# Altium footprint library Connector_PinHeader_1.00mm.PcbLib: 278 footprints (part 13 of 18)
Each footprint in its own frame and in the unit in brackets; x right, y up, seen from the top. Pads: shape width x height; smd on the part's side, far side on the other; paste and mask are expansions set on the pad; w line width, h text height; cw(c..) or ccw(c..) is an arc to the next point about the centre after c.
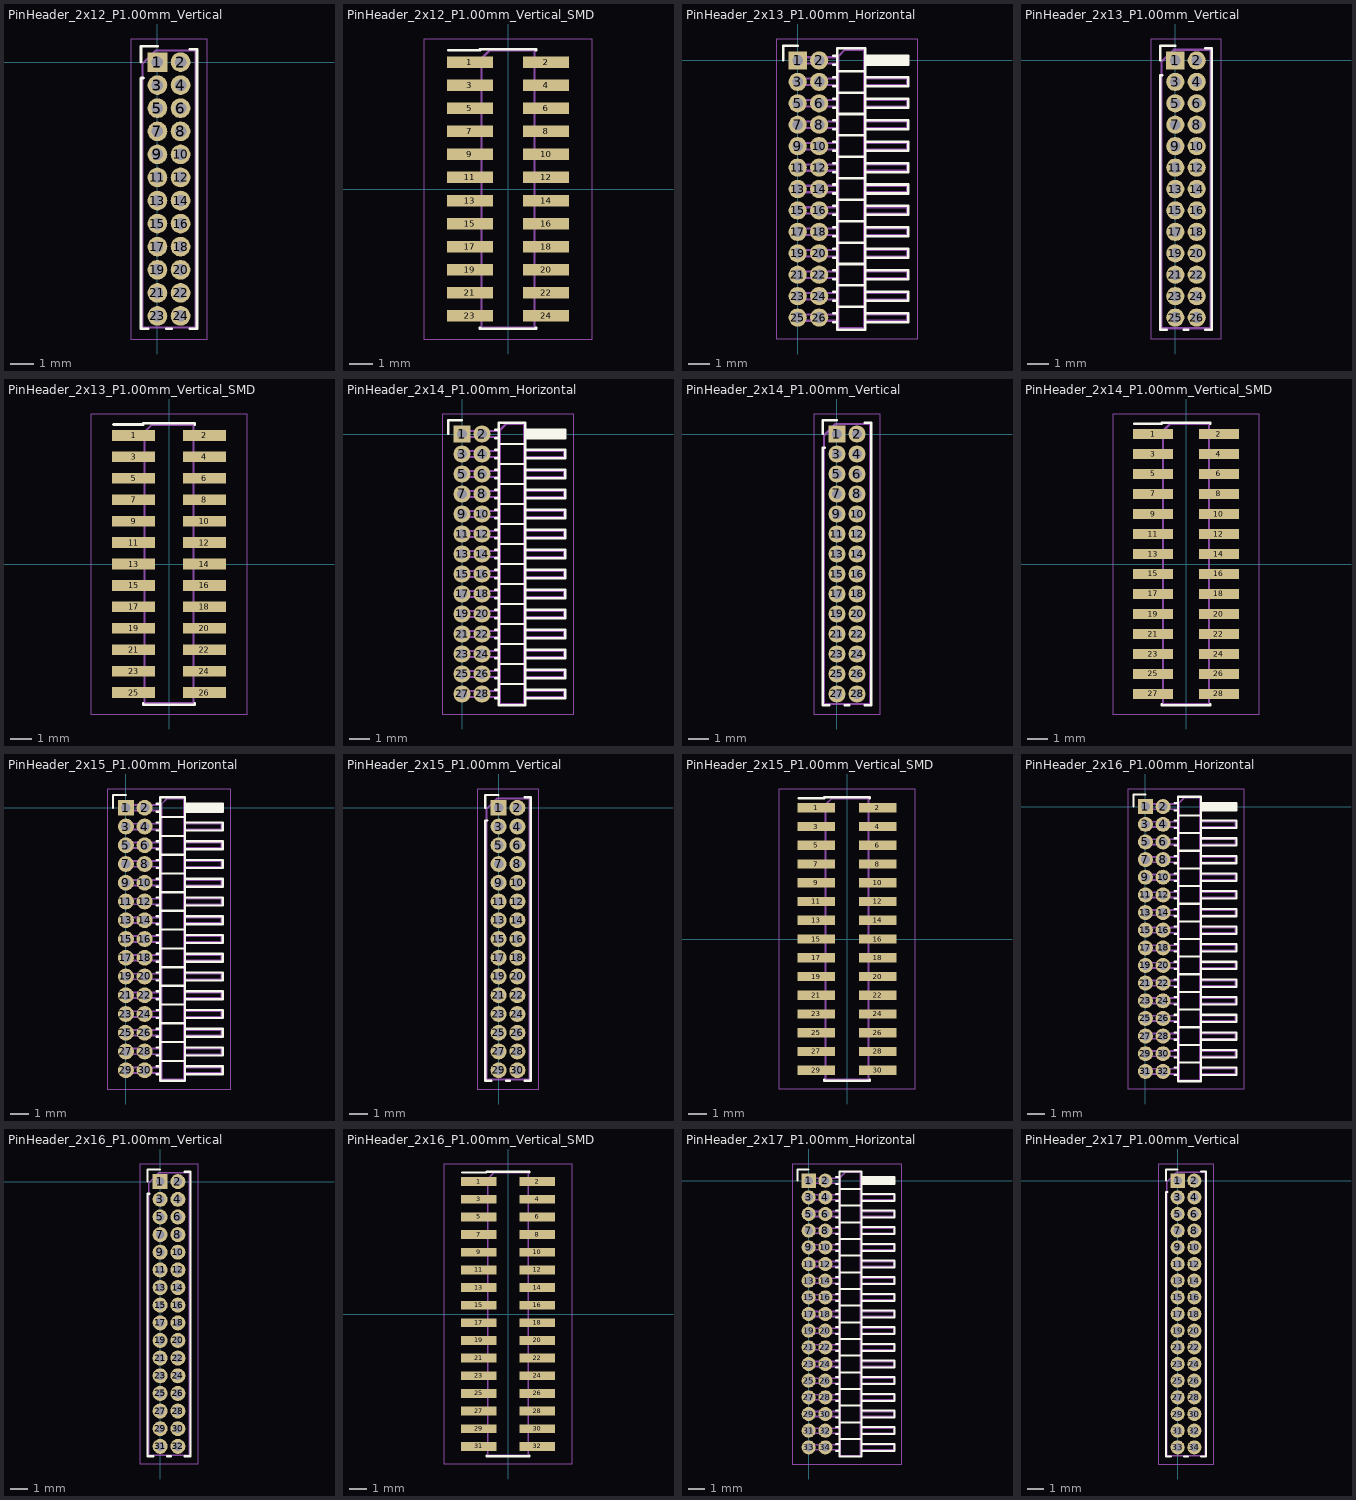
[diagram p12: the footprints below, top view; thin cyan lines are the x and y axes]

## PinHeader_2x12_P1.00mm_Vertical [mm]
pads (24):
  rect 0.85x0.85 hole 0.5: 1(0,0)
  rrect100% 0.85x0.85 hole 0.5: 2(1,0) 3(0,-1) 4(1,-1) 5(0,-2) 6(1,-2) 7(0,-3) 8(1,-3) 9(0,-4) 10(1,-4) 11(0,-5) 12(1,-5) 13(0,-6) 14(1,-6) 15(0,-7) 16(1,-7) 17(0,-8) 18(1,-8) 19(0,-9) 20(1,-9) 21(0,-10) 22(1,-10) 23(0,-11) 24(1,-11)
F.SilkS:
  lines w0.12: -0.71,0 -0.71,0.685 0,0.685 ; -0.608,-0.685 -0.71,-0.685 -0.71,-11.56 -0.394,-11.56 ; 0.394,-11.56 0.606,-11.56 ; 1.394,-11.56 1.71,-11.56 1.71,0.56 1.394,0.56
F.CrtYd:
  lines w0.05: -1.15,-12 2.15,-12 2.15,1 -1.15,1 -1.15,-12
F.Fab:
  lines w0.1: -0.65,-11.5 1.65,-11.5 1.65,0.5 -0.075,0.5 -0.65,-0.075 -0.65,-11.5
  text "'.Designator'" at 1.34,-9.547 h1

## PinHeader_2x12_P1.00mm_Vertical_SMD [mm]
pads (24):
  rect 2x0.5 smd: 1(-1.65,5.5) 2(1.65,5.5) 3(-1.65,4.5) 4(1.65,4.5) 5(-1.65,3.5) 6(1.65,3.5) 7(-1.65,2.5) 8(1.65,2.5) 9(-1.65,1.5) 10(1.65,1.5) 11(-1.65,0.5) 12(1.65,0.5) 13(-1.65,-0.5) 14(1.65,-0.5) 15(-1.65,-1.5) 16(1.65,-1.5) 17(-1.65,-2.5) 18(1.65,-2.5) 19(-1.65,-3.5) 20(1.65,-3.5) 21(-1.65,-4.5) 22(1.65,-4.5) 23(-1.65,-5.5) 24(1.65,-5.5)
F.SilkS:
  lines w0.12: -2.59,6.01 -1.21,6.01 -1.21,6.06 1.21,6.06 1.21,6.01 ; -1.21,-6.01 -1.21,-6.06 1.21,-6.06 1.21,-6.01
F.CrtYd:
  lines w0.05: -3.65,-6.5 3.65,-6.5 3.65,6.5 -3.65,6.5 -3.65,-6.5
F.Fab:
  lines w0.1: -1.15,-5.65 -2.4,-5.65 -2.4,-5.35 -1.15,-5.35 ; -1.15,-4.65 -2.4,-4.65 -2.4,-4.35 -1.15,-4.35 ; -1.15,-3.65 -2.4,-3.65 -2.4,-3.35 -1.15,-3.35 ; -1.15,-2.65 -2.4,-2.65 -2.4,-2.35 -1.15,-2.35 ; -1.15,-1.65 -2.4,-1.65 -2.4,-1.35 -1.15,-1.35 ; -1.15,-0.65 -2.4,-0.65 -2.4,-0.35 -1.15,-0.35 ; -1.15,0.35 -2.4,0.35 -2.4,0.65 -1.15,0.65 ; -1.15,1.35 -2.4,1.35 -2.4,1.65 -1.15,1.65 ; -1.15,2.35 -2.4,2.35 -2.4,2.65 -1.15,2.65 ; -1.15,3.35 -2.4,3.35 -2.4,3.65 -1.15,3.65 ; -1.15,4.35 -2.4,4.35 -2.4,4.65 -1.15,4.65 ; -1.15,5.35 -2.4,5.35 -2.4,5.65 -1.15,5.65 ; 1.15,-5.65 2.4,-5.65 2.4,-5.35 1.15,-5.35 ; 1.15,-4.65 2.4,-4.65 2.4,-4.35 1.15,-4.35 ; 1.15,-3.65 2.4,-3.65 2.4,-3.35 1.15,-3.35 ; 1.15,-2.65 2.4,-2.65 2.4,-2.35 1.15,-2.35 ; 1.15,-1.65 2.4,-1.65 2.4,-1.35 1.15,-1.35 ; 1.15,-0.65 2.4,-0.65 2.4,-0.35 1.15,-0.35 ; 1.15,0.35 2.4,0.35 2.4,0.65 1.15,0.65 ; 1.15,1.35 2.4,1.35 2.4,1.65 1.15,1.65 ; 1.15,2.35 2.4,2.35 2.4,2.65 1.15,2.65 ; 1.15,3.35 2.4,3.35 2.4,3.65 1.15,3.65 ; 1.15,4.35 2.4,4.35 2.4,4.65 1.15,4.65 ; 1.15,5.35 2.4,5.35 2.4,5.65 1.15,5.65 ; -1.15,5.65 -0.8,6 1.15,6 1.15,-6 -1.15,-6 -1.15,5.65
  text "'.Designator'" at 0.84,-4.047 h1

## PinHeader_2x13_P1.00mm_Horizontal [mm]
pads (26):
  rect 0.85x0.85 hole 0.5: 1(0,0)
  rrect100% 0.85x0.85 hole 0.5: 2(1,0) 3(0,-1) 4(1,-1) 5(0,-2) 6(1,-2) 7(0,-3) 8(1,-3) 9(0,-4) 10(1,-4) 11(0,-5) 12(1,-5) 13(0,-6) 14(1,-6) 15(0,-7) 16(1,-7) 17(0,-8) 18(1,-8) 19(0,-9) 20(1,-9) 21(0,-10) 22(1,-10) 23(0,-11) 24(1,-11) 25(0,-12) 26(1,-12)
F.SilkS:
  lines w0.12: -0.685,0 -0.685,0.685 0,0.685 ; 1.652,-12.21 1.84,-12.21 ; 1.652,-11.79 1.84,-11.79 ; 1.652,-11.21 1.84,-11.21 ; 1.652,-10.79 1.84,-10.79 ; 1.652,-10.21 1.84,-10.21 ; 1.652,-9.79 1.84,-9.79 ; 1.652,-9.21 1.84,-9.21 ; 1.652,-8.79 1.84,-8.79 ; 1.652,-8.21 1.84,-8.21 ; 1.652,-7.79 1.84,-7.79 ; 1.652,-7.21 1.84,-7.21 ; 1.652,-6.79 1.84,-6.79 ; 1.652,-6.21 1.84,-6.21 ; 1.652,-5.79 1.84,-5.79 ; 1.652,-5.21 1.84,-5.21 ; 1.652,-4.79 1.84,-4.79 ; 1.652,-4.21 1.84,-4.21 ; 1.652,-3.79 1.84,-3.79 ; 1.652,-3.21 1.84,-3.21 ; 1.652,-2.79 1.84,-2.79 ; 1.652,-2.21 1.84,-2.21 ; 1.652,-1.79 1.84,-1.79 ; 1.652,-1.21 1.84,-1.21 ; 1.652,-0.79 1.84,-0.79 ; 1.652,-0.21 1.84,-0.21 ; 1.652,0.21 1.84,0.21 ; 1.84,-11.5 3.16,-11.5 ; 1.84,-10.5 3.16,-10.5 ; 1.84,-9.5 3.16,-9.5 ; 1.84,-8.5 3.16,-8.5 ; 1.84,-7.5 3.16,-7.5 ; 1.84,-6.5 3.16,-6.5 ; 1.84,-5.5 3.16,-5.5 ; 1.84,-4.5 3.16,-4.5 ; 1.84,-3.5 3.16,-3.5 ; 1.84,-2.5 3.16,-2.5 ; 1.84,-1.5 3.16,-1.5 ; 1.84,-0.5 3.16,-0.5 ; 3.16,-12.21 5.16,-12.21 5.16,-11.79 3.16,-11.79 ; 3.16,-11.21 5.16,-11.21 5.16,-10.79 3.16,-10.79 ; 3.16,-10.21 5.16,-10.21 5.16,-9.79 3.16,-9.79 ; 3.16,-9.21 5.16,-9.21 5.16,-8.79 3.16,-8.79 ; 3.16,-8.21 5.16,-8.21 5.16,-7.79 3.16,-7.79 ; 3.16,-7.21 5.16,-7.21 5.16,-6.79 3.16,-6.79 ; 3.16,-6.21 5.16,-6.21 5.16,-5.79 3.16,-5.79 ; 3.16,-5.21 5.16,-5.21 5.16,-4.79 3.16,-4.79 ; 3.16,-4.21 5.16,-4.21 5.16,-3.79 3.16,-3.79 ; 3.16,-3.21 5.16,-3.21 5.16,-2.79 3.16,-2.79 ; 3.16,-2.21 5.16,-2.21 5.16,-1.79 3.16,-1.79 ; 3.16,-1.21 5.16,-1.21 5.16,-0.79 3.16,-0.79 ; 3.16,-0.21 5.16,-0.21 5.16,0.21 3.16,0.21 ; 3.16,-0.09 5.16,-0.09 ; 3.16,0.03 5.16,0.03 ; 3.16,0.15 5.16,0.15 ; 1.84,-12.56 3.16,-12.56 3.16,0.56 1.84,0.56 1.84,-12.56
F.CrtYd:
  lines w0.05: -1,-13 -1,1 5.6,1 5.6,-13 -1,-13
F.Fab:
  lines w0.1: 1.9,-12.15 -0.15,-12.15 -0.15,-11.85 1.9,-11.85 ; 1.9,-11.15 -0.15,-11.15 -0.15,-10.85 1.9,-10.85 ; 1.9,-10.15 -0.15,-10.15 -0.15,-9.85 1.9,-9.85 ; 1.9,-9.15 -0.15,-9.15 -0.15,-8.85 1.9,-8.85 ; 1.9,-8.15 -0.15,-8.15 -0.15,-7.85 1.9,-7.85 ; 1.9,-7.15 -0.15,-7.15 -0.15,-6.85 1.9,-6.85 ; 1.9,-6.15 -0.15,-6.15 -0.15,-5.85 1.9,-5.85 ; 1.9,-5.15 -0.15,-5.15 -0.15,-4.85 1.9,-4.85 ; 1.9,-4.15 -0.15,-4.15 -0.15,-3.85 1.9,-3.85 ; 1.9,-3.15 -0.15,-3.15 -0.15,-2.85 1.9,-2.85 ; 1.9,-2.15 -0.15,-2.15 -0.15,-1.85 1.9,-1.85 ; 1.9,-1.15 -0.15,-1.15 -0.15,-0.85 1.9,-0.85 ; 1.9,-0.15 -0.15,-0.15 -0.15,0.15 1.9,0.15 ; 3.1,-12.15 5.1,-12.15 5.1,-11.85 3.1,-11.85 ; 3.1,-11.15 5.1,-11.15 5.1,-10.85 3.1,-10.85 ; 3.1,-10.15 5.1,-10.15 5.1,-9.85 3.1,-9.85 ; 3.1,-9.15 5.1,-9.15 5.1,-8.85 3.1,-8.85 ; 3.1,-8.15 5.1,-8.15 5.1,-7.85 3.1,-7.85 ; 3.1,-7.15 5.1,-7.15 5.1,-6.85 3.1,-6.85 ; 3.1,-6.15 5.1,-6.15 5.1,-5.85 3.1,-5.85 ; 3.1,-5.15 5.1,-5.15 5.1,-4.85 3.1,-4.85 ; 3.1,-4.15 5.1,-4.15 5.1,-3.85 3.1,-3.85 ; 3.1,-3.15 5.1,-3.15 5.1,-2.85 3.1,-2.85 ; 3.1,-2.15 5.1,-2.15 5.1,-1.85 3.1,-1.85 ; 3.1,-1.15 5.1,-1.15 5.1,-0.85 3.1,-0.85 ; 3.1,-0.15 5.1,-0.15 5.1,0.15 3.1,0.15 ; 1.9,-12.5 1.9,0.2 2.2,0.5 3.1,0.5 3.1,-12.5 1.9,-12.5
  text "'.Designator'" at 3.105,-8.914 h0.72

## PinHeader_2x13_P1.00mm_Vertical [mm]
pads (26):
  rect 0.85x0.85 hole 0.5: 1(0,0)
  rrect100% 0.85x0.85 hole 0.5: 2(1,0) 3(0,-1) 4(1,-1) 5(0,-2) 6(1,-2) 7(0,-3) 8(1,-3) 9(0,-4) 10(1,-4) 11(0,-5) 12(1,-5) 13(0,-6) 14(1,-6) 15(0,-7) 16(1,-7) 17(0,-8) 18(1,-8) 19(0,-9) 20(1,-9) 21(0,-10) 22(1,-10) 23(0,-11) 24(1,-11) 25(0,-12) 26(1,-12)
F.SilkS:
  lines w0.12: -0.71,0 -0.71,0.685 0,0.685 ; -0.608,-0.685 -0.71,-0.685 -0.71,-12.56 -0.394,-12.56 ; 0.394,-12.56 0.606,-12.56 ; 1.394,-12.56 1.71,-12.56 1.71,0.56 1.394,0.56
F.CrtYd:
  lines w0.05: -1.15,-13 2.15,-13 2.15,1 -1.15,1 -1.15,-13
F.Fab:
  lines w0.1: -0.65,-12.5 1.65,-12.5 1.65,0.5 -0.075,0.5 -0.65,-0.075 -0.65,-12.5
  text "'.Designator'" at 1.34,-10.047 h1

## PinHeader_2x13_P1.00mm_Vertical_SMD [mm]
pads (26):
  rect 2x0.5 smd: 1(-1.65,6) 2(1.65,6) 3(-1.65,5) 4(1.65,5) 5(-1.65,4) 6(1.65,4) 7(-1.65,3) 8(1.65,3) 9(-1.65,2) 10(1.65,2) 11(-1.65,1) 12(1.65,1) 13(-1.65,0) 14(1.65,0) 15(-1.65,-1) 16(1.65,-1) 17(-1.65,-2) 18(1.65,-2) 19(-1.65,-3) 20(1.65,-3) 21(-1.65,-4) 22(1.65,-4) 23(-1.65,-5) 24(1.65,-5) 25(-1.65,-6) 26(1.65,-6)
F.SilkS:
  lines w0.12: -2.59,6.51 -1.21,6.51 -1.21,6.56 1.21,6.56 1.21,6.51 ; -1.21,-6.51 -1.21,-6.56 1.21,-6.56 1.21,-6.51
F.CrtYd:
  lines w0.05: -3.65,-7 -3.65,7 3.65,7 3.65,-7 -3.65,-7
F.Fab:
  lines w0.1: -1.15,-6.15 -2.4,-6.15 -2.4,-5.85 -1.15,-5.85 ; -1.15,-5.15 -2.4,-5.15 -2.4,-4.85 -1.15,-4.85 ; -1.15,-4.15 -2.4,-4.15 -2.4,-3.85 -1.15,-3.85 ; -1.15,-3.15 -2.4,-3.15 -2.4,-2.85 -1.15,-2.85 ; -1.15,-2.15 -2.4,-2.15 -2.4,-1.85 -1.15,-1.85 ; -1.15,-1.15 -2.4,-1.15 -2.4,-0.85 -1.15,-0.85 ; -1.15,-0.15 -2.4,-0.15 -2.4,0.15 -1.15,0.15 ; -1.15,0.85 -2.4,0.85 -2.4,1.15 -1.15,1.15 ; -1.15,1.85 -2.4,1.85 -2.4,2.15 -1.15,2.15 ; -1.15,2.85 -2.4,2.85 -2.4,3.15 -1.15,3.15 ; -1.15,3.85 -2.4,3.85 -2.4,4.15 -1.15,4.15 ; -1.15,4.85 -2.4,4.85 -2.4,5.15 -1.15,5.15 ; -1.15,5.85 -2.4,5.85 -2.4,6.15 -1.15,6.15 ; 1.15,-6.15 2.4,-6.15 2.4,-5.85 1.15,-5.85 ; 1.15,-5.15 2.4,-5.15 2.4,-4.85 1.15,-4.85 ; 1.15,-4.15 2.4,-4.15 2.4,-3.85 1.15,-3.85 ; 1.15,-3.15 2.4,-3.15 2.4,-2.85 1.15,-2.85 ; 1.15,-2.15 2.4,-2.15 2.4,-1.85 1.15,-1.85 ; 1.15,-1.15 2.4,-1.15 2.4,-0.85 1.15,-0.85 ; 1.15,-0.15 2.4,-0.15 2.4,0.15 1.15,0.15 ; 1.15,0.85 2.4,0.85 2.4,1.15 1.15,1.15 ; 1.15,1.85 2.4,1.85 2.4,2.15 1.15,2.15 ; 1.15,2.85 2.4,2.85 2.4,3.15 1.15,3.15 ; 1.15,3.85 2.4,3.85 2.4,4.15 1.15,4.15 ; 1.15,4.85 2.4,4.85 2.4,5.15 1.15,5.15 ; 1.15,5.85 2.4,5.85 2.4,6.15 1.15,6.15 ; -1.15,6.15 -1.15,-6.5 1.15,-6.5 1.15,6.5 -0.8,6.5 -1.15,6.15
  text "'.Designator'" at 0.84,-4.047 h1

## PinHeader_2x14_P1.00mm_Horizontal [mm]
pads (28):
  rect 0.85x0.85 hole 0.5: 1(0,0)
  rrect100% 0.85x0.85 hole 0.5: 2(1,0) 3(0,-1) 4(1,-1) 5(0,-2) 6(1,-2) 7(0,-3) 8(1,-3) 9(0,-4) 10(1,-4) 11(0,-5) 12(1,-5) 13(0,-6) 14(1,-6) 15(0,-7) 16(1,-7) 17(0,-8) 18(1,-8) 19(0,-9) 20(1,-9) 21(0,-10) 22(1,-10) 23(0,-11) 24(1,-11) 25(0,-12) 26(1,-12) 27(0,-13) 28(1,-13)
F.SilkS:
  lines w0.12: -0.685,0 -0.685,0.685 0,0.685 ; 1.652,-13.21 1.84,-13.21 ; 1.652,-12.79 1.84,-12.79 ; 1.652,-12.21 1.84,-12.21 ; 1.652,-11.79 1.84,-11.79 ; 1.652,-11.21 1.84,-11.21 ; 1.652,-10.79 1.84,-10.79 ; 1.652,-10.21 1.84,-10.21 ; 1.652,-9.79 1.84,-9.79 ; 1.652,-9.21 1.84,-9.21 ; 1.652,-8.79 1.84,-8.79 ; 1.652,-8.21 1.84,-8.21 ; 1.652,-7.79 1.84,-7.79 ; 1.652,-7.21 1.84,-7.21 ; 1.652,-6.79 1.84,-6.79 ; 1.652,-6.21 1.84,-6.21 ; 1.652,-5.79 1.84,-5.79 ; 1.652,-5.21 1.84,-5.21 ; 1.652,-4.79 1.84,-4.79 ; 1.652,-4.21 1.84,-4.21 ; 1.652,-3.79 1.84,-3.79 ; 1.652,-3.21 1.84,-3.21 ; 1.652,-2.79 1.84,-2.79 ; 1.652,-2.21 1.84,-2.21 ; 1.652,-1.79 1.84,-1.79 ; 1.652,-1.21 1.84,-1.21 ; 1.652,-0.79 1.84,-0.79 ; 1.652,-0.21 1.84,-0.21 ; 1.652,0.21 1.84,0.21 ; 1.84,-12.5 3.16,-12.5 ; 1.84,-11.5 3.16,-11.5 ; 1.84,-10.5 3.16,-10.5 ; 1.84,-9.5 3.16,-9.5 ; 1.84,-8.5 3.16,-8.5 ; 1.84,-7.5 3.16,-7.5 ; 1.84,-6.5 3.16,-6.5 ; 1.84,-5.5 3.16,-5.5 ; 1.84,-4.5 3.16,-4.5 ; 1.84,-3.5 3.16,-3.5 ; 1.84,-2.5 3.16,-2.5 ; 1.84,-1.5 3.16,-1.5 ; 1.84,-0.5 3.16,-0.5 ; 3.16,-13.21 5.16,-13.21 5.16,-12.79 3.16,-12.79 ; 3.16,-12.21 5.16,-12.21 5.16,-11.79 3.16,-11.79 ; 3.16,-11.21 5.16,-11.21 5.16,-10.79 3.16,-10.79 ; 3.16,-10.21 5.16,-10.21 5.16,-9.79 3.16,-9.79 ; 3.16,-9.21 5.16,-9.21 5.16,-8.79 3.16,-8.79 ; 3.16,-8.21 5.16,-8.21 5.16,-7.79 3.16,-7.79 ; 3.16,-7.21 5.16,-7.21 5.16,-6.79 3.16,-6.79 ; 3.16,-6.21 5.16,-6.21 5.16,-5.79 3.16,-5.79 ; 3.16,-5.21 5.16,-5.21 5.16,-4.79 3.16,-4.79 ; 3.16,-4.21 5.16,-4.21 5.16,-3.79 3.16,-3.79 ; 3.16,-3.21 5.16,-3.21 5.16,-2.79 3.16,-2.79 ; 3.16,-2.21 5.16,-2.21 5.16,-1.79 3.16,-1.79 ; 3.16,-1.21 5.16,-1.21 5.16,-0.79 3.16,-0.79 ; 3.16,-0.21 5.16,-0.21 5.16,0.21 3.16,0.21 ; 3.16,-0.09 5.16,-0.09 ; 3.16,0.03 5.16,0.03 ; 3.16,0.15 5.16,0.15 ; 1.84,-13.56 3.16,-13.56 3.16,0.56 1.84,0.56 1.84,-13.56
F.CrtYd:
  lines w0.05: -1,-14 5.6,-14 5.6,1 -1,1 -1,-14
F.Fab:
  lines w0.1: 1.9,-13.15 -0.15,-13.15 -0.15,-12.85 1.9,-12.85 ; 1.9,-12.15 -0.15,-12.15 -0.15,-11.85 1.9,-11.85 ; 1.9,-11.15 -0.15,-11.15 -0.15,-10.85 1.9,-10.85 ; 1.9,-10.15 -0.15,-10.15 -0.15,-9.85 1.9,-9.85 ; 1.9,-9.15 -0.15,-9.15 -0.15,-8.85 1.9,-8.85 ; 1.9,-8.15 -0.15,-8.15 -0.15,-7.85 1.9,-7.85 ; 1.9,-7.15 -0.15,-7.15 -0.15,-6.85 1.9,-6.85 ; 1.9,-6.15 -0.15,-6.15 -0.15,-5.85 1.9,-5.85 ; 1.9,-5.15 -0.15,-5.15 -0.15,-4.85 1.9,-4.85 ; 1.9,-4.15 -0.15,-4.15 -0.15,-3.85 1.9,-3.85 ; 1.9,-3.15 -0.15,-3.15 -0.15,-2.85 1.9,-2.85 ; 1.9,-2.15 -0.15,-2.15 -0.15,-1.85 1.9,-1.85 ; 1.9,-1.15 -0.15,-1.15 -0.15,-0.85 1.9,-0.85 ; 1.9,-0.15 -0.15,-0.15 -0.15,0.15 1.9,0.15 ; 3.1,-13.15 5.1,-13.15 5.1,-12.85 3.1,-12.85 ; 3.1,-12.15 5.1,-12.15 5.1,-11.85 3.1,-11.85 ; 3.1,-11.15 5.1,-11.15 5.1,-10.85 3.1,-10.85 ; 3.1,-10.15 5.1,-10.15 5.1,-9.85 3.1,-9.85 ; 3.1,-9.15 5.1,-9.15 5.1,-8.85 3.1,-8.85 ; 3.1,-8.15 5.1,-8.15 5.1,-7.85 3.1,-7.85 ; 3.1,-7.15 5.1,-7.15 5.1,-6.85 3.1,-6.85 ; 3.1,-6.15 5.1,-6.15 5.1,-5.85 3.1,-5.85 ; 3.1,-5.15 5.1,-5.15 5.1,-4.85 3.1,-4.85 ; 3.1,-4.15 5.1,-4.15 5.1,-3.85 3.1,-3.85 ; 3.1,-3.15 5.1,-3.15 5.1,-2.85 3.1,-2.85 ; 3.1,-2.15 5.1,-2.15 5.1,-1.85 3.1,-1.85 ; 3.1,-1.15 5.1,-1.15 5.1,-0.85 3.1,-0.85 ; 3.1,-0.15 5.1,-0.15 5.1,0.15 3.1,0.15 ; 1.9,-13.5 3.1,-13.5 3.1,0.5 2.2,0.5 1.9,0.2 1.9,-13.5
  text "'.Designator'" at 3.105,-9.414 h0.72

## PinHeader_2x14_P1.00mm_Vertical [mm]
pads (28):
  rect 0.85x0.85 hole 0.5: 1(0,0)
  rrect100% 0.85x0.85 hole 0.5: 2(1,0) 3(0,-1) 4(1,-1) 5(0,-2) 6(1,-2) 7(0,-3) 8(1,-3) 9(0,-4) 10(1,-4) 11(0,-5) 12(1,-5) 13(0,-6) 14(1,-6) 15(0,-7) 16(1,-7) 17(0,-8) 18(1,-8) 19(0,-9) 20(1,-9) 21(0,-10) 22(1,-10) 23(0,-11) 24(1,-11) 25(0,-12) 26(1,-12) 27(0,-13) 28(1,-13)
F.SilkS:
  lines w0.12: -0.71,0 -0.71,0.685 0,0.685 ; -0.608,-0.685 -0.71,-0.685 -0.71,-13.56 -0.394,-13.56 ; 0.394,-13.56 0.606,-13.56 ; 1.394,-13.56 1.71,-13.56 1.71,0.56 1.394,0.56
F.CrtYd:
  lines w0.05: -1.15,-14 2.15,-14 2.15,1 -1.15,1 -1.15,-14
F.Fab:
  lines w0.1: -0.65,-13.5 1.65,-13.5 1.65,0.5 -0.075,0.5 -0.65,-0.075 -0.65,-13.5
  text "'.Designator'" at 1.34,-10.547 h1

## PinHeader_2x14_P1.00mm_Vertical_SMD [mm]
pads (28):
  rect 2x0.5 smd: 1(-1.65,6.5) 2(1.65,6.5) 3(-1.65,5.5) 4(1.65,5.5) 5(-1.65,4.5) 6(1.65,4.5) 7(-1.65,3.5) 8(1.65,3.5) 9(-1.65,2.5) 10(1.65,2.5) 11(-1.65,1.5) 12(1.65,1.5) 13(-1.65,0.5) 14(1.65,0.5) 15(-1.65,-0.5) 16(1.65,-0.5) 17(-1.65,-1.5) 18(1.65,-1.5) 19(-1.65,-2.5) 20(1.65,-2.5) 21(-1.65,-3.5) 22(1.65,-3.5) 23(-1.65,-4.5) 24(1.65,-4.5) 25(-1.65,-5.5) 26(1.65,-5.5) 27(-1.65,-6.5) 28(1.65,-6.5)
F.SilkS:
  lines w0.12: -2.59,7.01 -1.21,7.01 -1.21,7.06 1.21,7.06 1.21,7.01 ; -1.21,-7.01 -1.21,-7.06 1.21,-7.06 1.21,-7.01
F.CrtYd:
  lines w0.05: -3.65,-7.5 -3.65,7.5 3.65,7.5 3.65,-7.5 -3.65,-7.5
F.Fab:
  lines w0.1: -1.15,-6.65 -2.4,-6.65 -2.4,-6.35 -1.15,-6.35 ; -1.15,-5.65 -2.4,-5.65 -2.4,-5.35 -1.15,-5.35 ; -1.15,-4.65 -2.4,-4.65 -2.4,-4.35 -1.15,-4.35 ; -1.15,-3.65 -2.4,-3.65 -2.4,-3.35 -1.15,-3.35 ; -1.15,-2.65 -2.4,-2.65 -2.4,-2.35 -1.15,-2.35 ; -1.15,-1.65 -2.4,-1.65 -2.4,-1.35 -1.15,-1.35 ; -1.15,-0.65 -2.4,-0.65 -2.4,-0.35 -1.15,-0.35 ; -1.15,0.35 -2.4,0.35 -2.4,0.65 -1.15,0.65 ; -1.15,1.35 -2.4,1.35 -2.4,1.65 -1.15,1.65 ; -1.15,2.35 -2.4,2.35 -2.4,2.65 -1.15,2.65 ; -1.15,3.35 -2.4,3.35 -2.4,3.65 -1.15,3.65 ; -1.15,4.35 -2.4,4.35 -2.4,4.65 -1.15,4.65 ; -1.15,5.35 -2.4,5.35 -2.4,5.65 -1.15,5.65 ; -1.15,6.35 -2.4,6.35 -2.4,6.65 -1.15,6.65 ; 1.15,-6.65 2.4,-6.65 2.4,-6.35 1.15,-6.35 ; 1.15,-5.65 2.4,-5.65 2.4,-5.35 1.15,-5.35 ; 1.15,-4.65 2.4,-4.65 2.4,-4.35 1.15,-4.35 ; 1.15,-3.65 2.4,-3.65 2.4,-3.35 1.15,-3.35 ; 1.15,-2.65 2.4,-2.65 2.4,-2.35 1.15,-2.35 ; 1.15,-1.65 2.4,-1.65 2.4,-1.35 1.15,-1.35 ; 1.15,-0.65 2.4,-0.65 2.4,-0.35 1.15,-0.35 ; 1.15,0.35 2.4,0.35 2.4,0.65 1.15,0.65 ; 1.15,1.35 2.4,1.35 2.4,1.65 1.15,1.65 ; 1.15,2.35 2.4,2.35 2.4,2.65 1.15,2.65 ; 1.15,3.35 2.4,3.35 2.4,3.65 1.15,3.65 ; 1.15,4.35 2.4,4.35 2.4,4.65 1.15,4.65 ; 1.15,5.35 2.4,5.35 2.4,5.65 1.15,5.65 ; 1.15,6.35 2.4,6.35 2.4,6.65 1.15,6.65 ; -1.15,6.65 -1.15,-7 1.15,-7 1.15,7 -0.8,7 -1.15,6.65
  text "'.Designator'" at 0.84,-4.047 h1

## PinHeader_2x15_P1.00mm_Horizontal [mm]
pads (30):
  rect 0.85x0.85 hole 0.5: 1(0,0)
  rrect100% 0.85x0.85 hole 0.5: 2(1,0) 3(0,-1) 4(1,-1) 5(0,-2) 6(1,-2) 7(0,-3) 8(1,-3) 9(0,-4) 10(1,-4) 11(0,-5) 12(1,-5) 13(0,-6) 14(1,-6) 15(0,-7) 16(1,-7) 17(0,-8) 18(1,-8) 19(0,-9) 20(1,-9) 21(0,-10) 22(1,-10) 23(0,-11) 24(1,-11) 25(0,-12) 26(1,-12) 27(0,-13) 28(1,-13) 29(0,-14) 30(1,-14)
F.SilkS:
  lines w0.12: -0.685,0 -0.685,0.685 0,0.685 ; 1.652,-14.21 1.84,-14.21 ; 1.652,-13.79 1.84,-13.79 ; 1.652,-13.21 1.84,-13.21 ; 1.652,-12.79 1.84,-12.79 ; 1.652,-12.21 1.84,-12.21 ; 1.652,-11.79 1.84,-11.79 ; 1.652,-11.21 1.84,-11.21 ; 1.652,-10.79 1.84,-10.79 ; 1.652,-10.21 1.84,-10.21 ; 1.652,-9.79 1.84,-9.79 ; 1.652,-9.21 1.84,-9.21 ; 1.652,-8.79 1.84,-8.79 ; 1.652,-8.21 1.84,-8.21 ; 1.652,-7.79 1.84,-7.79 ; 1.652,-7.21 1.84,-7.21 ; 1.652,-6.79 1.84,-6.79 ; 1.652,-6.21 1.84,-6.21 ; 1.652,-5.79 1.84,-5.79 ; 1.652,-5.21 1.84,-5.21 ; 1.652,-4.79 1.84,-4.79 ; 1.652,-4.21 1.84,-4.21 ; 1.652,-3.79 1.84,-3.79 ; 1.652,-3.21 1.84,-3.21 ; 1.652,-2.79 1.84,-2.79 ; 1.652,-2.21 1.84,-2.21 ; 1.652,-1.79 1.84,-1.79 ; 1.652,-1.21 1.84,-1.21 ; 1.652,-0.79 1.84,-0.79 ; 1.652,-0.21 1.84,-0.21 ; 1.652,0.21 1.84,0.21 ; 1.84,-13.5 3.16,-13.5 ; 1.84,-12.5 3.16,-12.5 ; 1.84,-11.5 3.16,-11.5 ; 1.84,-10.5 3.16,-10.5 ; 1.84,-9.5 3.16,-9.5 ; 1.84,-8.5 3.16,-8.5 ; 1.84,-7.5 3.16,-7.5 ; 1.84,-6.5 3.16,-6.5 ; 1.84,-5.5 3.16,-5.5 ; 1.84,-4.5 3.16,-4.5 ; 1.84,-3.5 3.16,-3.5 ; 1.84,-2.5 3.16,-2.5 ; 1.84,-1.5 3.16,-1.5 ; 1.84,-0.5 3.16,-0.5 ; 3.16,-14.21 5.16,-14.21 5.16,-13.79 3.16,-13.79 ; 3.16,-13.21 5.16,-13.21 5.16,-12.79 3.16,-12.79 ; 3.16,-12.21 5.16,-12.21 5.16,-11.79 3.16,-11.79 ; 3.16,-11.21 5.16,-11.21 5.16,-10.79 3.16,-10.79 ; 3.16,-10.21 5.16,-10.21 5.16,-9.79 3.16,-9.79 ; 3.16,-9.21 5.16,-9.21 5.16,-8.79 3.16,-8.79 ; 3.16,-8.21 5.16,-8.21 5.16,-7.79 3.16,-7.79 ; 3.16,-7.21 5.16,-7.21 5.16,-6.79 3.16,-6.79 ; 3.16,-6.21 5.16,-6.21 5.16,-5.79 3.16,-5.79 ; 3.16,-5.21 5.16,-5.21 5.16,-4.79 3.16,-4.79 ; 3.16,-4.21 5.16,-4.21 5.16,-3.79 3.16,-3.79 ; 3.16,-3.21 5.16,-3.21 5.16,-2.79 3.16,-2.79 ; 3.16,-2.21 5.16,-2.21 5.16,-1.79 3.16,-1.79 ; 3.16,-1.21 5.16,-1.21 5.16,-0.79 3.16,-0.79 ; 3.16,-0.21 5.16,-0.21 5.16,0.21 3.16,0.21 ; 3.16,-0.09 5.16,-0.09 ; 3.16,0.03 5.16,0.03 ; 3.16,0.15 5.16,0.15 ; 1.84,-14.56 1.84,0.56 3.16,0.56 3.16,-14.56 1.84,-14.56
F.CrtYd:
  lines w0.05: -1,-15 -1,1 5.6,1 5.6,-15 -1,-15
F.Fab:
  lines w0.1: 1.9,-14.15 -0.15,-14.15 -0.15,-13.85 1.9,-13.85 ; 1.9,-13.15 -0.15,-13.15 -0.15,-12.85 1.9,-12.85 ; 1.9,-12.15 -0.15,-12.15 -0.15,-11.85 1.9,-11.85 ; 1.9,-11.15 -0.15,-11.15 -0.15,-10.85 1.9,-10.85 ; 1.9,-10.15 -0.15,-10.15 -0.15,-9.85 1.9,-9.85 ; 1.9,-9.15 -0.15,-9.15 -0.15,-8.85 1.9,-8.85 ; 1.9,-8.15 -0.15,-8.15 -0.15,-7.85 1.9,-7.85 ; 1.9,-7.15 -0.15,-7.15 -0.15,-6.85 1.9,-6.85 ; 1.9,-6.15 -0.15,-6.15 -0.15,-5.85 1.9,-5.85 ; 1.9,-5.15 -0.15,-5.15 -0.15,-4.85 1.9,-4.85 ; 1.9,-4.15 -0.15,-4.15 -0.15,-3.85 1.9,-3.85 ; 1.9,-3.15 -0.15,-3.15 -0.15,-2.85 1.9,-2.85 ; 1.9,-2.15 -0.15,-2.15 -0.15,-1.85 1.9,-1.85 ; 1.9,-1.15 -0.15,-1.15 -0.15,-0.85 1.9,-0.85 ; 1.9,-0.15 -0.15,-0.15 -0.15,0.15 1.9,0.15 ; 3.1,-14.15 5.1,-14.15 5.1,-13.85 3.1,-13.85 ; 3.1,-13.15 5.1,-13.15 5.1,-12.85 3.1,-12.85 ; 3.1,-12.15 5.1,-12.15 5.1,-11.85 3.1,-11.85 ; 3.1,-11.15 5.1,-11.15 5.1,-10.85 3.1,-10.85 ; 3.1,-10.15 5.1,-10.15 5.1,-9.85 3.1,-9.85 ; 3.1,-9.15 5.1,-9.15 5.1,-8.85 3.1,-8.85 ; 3.1,-8.15 5.1,-8.15 5.1,-7.85 3.1,-7.85 ; 3.1,-7.15 5.1,-7.15 5.1,-6.85 3.1,-6.85 ; 3.1,-6.15 5.1,-6.15 5.1,-5.85 3.1,-5.85 ; 3.1,-5.15 5.1,-5.15 5.1,-4.85 3.1,-4.85 ; 3.1,-4.15 5.1,-4.15 5.1,-3.85 3.1,-3.85 ; 3.1,-3.15 5.1,-3.15 5.1,-2.85 3.1,-2.85 ; 3.1,-2.15 5.1,-2.15 5.1,-1.85 3.1,-1.85 ; 3.1,-1.15 5.1,-1.15 5.1,-0.85 3.1,-0.85 ; 3.1,-0.15 5.1,-0.15 5.1,0.15 3.1,0.15 ; 1.9,-14.5 3.1,-14.5 3.1,0.5 2.2,0.5 1.9,0.2 1.9,-14.5
  text "'.Designator'" at 3.105,-9.914 h0.72

## PinHeader_2x15_P1.00mm_Vertical [mm]
pads (30):
  rect 0.85x0.85 hole 0.5: 1(0,0)
  rrect100% 0.85x0.85 hole 0.5: 2(1,0) 3(0,-1) 4(1,-1) 5(0,-2) 6(1,-2) 7(0,-3) 8(1,-3) 9(0,-4) 10(1,-4) 11(0,-5) 12(1,-5) 13(0,-6) 14(1,-6) 15(0,-7) 16(1,-7) 17(0,-8) 18(1,-8) 19(0,-9) 20(1,-9) 21(0,-10) 22(1,-10) 23(0,-11) 24(1,-11) 25(0,-12) 26(1,-12) 27(0,-13) 28(1,-13) 29(0,-14) 30(1,-14)
F.SilkS:
  lines w0.12: -0.71,0 -0.71,0.685 0,0.685 ; -0.608,-0.685 -0.71,-0.685 -0.71,-14.56 -0.394,-14.56 ; 0.394,-14.56 0.606,-14.56 ; 1.394,-14.56 1.71,-14.56 1.71,0.56 1.394,0.56
F.CrtYd:
  lines w0.05: -1.15,-15 -1.15,1 2.15,1 2.15,-15 -1.15,-15
F.Fab:
  lines w0.1: -0.65,-14.5 -0.65,-0.075 -0.075,0.5 1.65,0.5 1.65,-14.5 -0.65,-14.5
  text "'.Designator'" at 1.34,-11.047 h1

## PinHeader_2x15_P1.00mm_Vertical_SMD [mm]
pads (30):
  rect 2x0.5 smd: 1(-1.65,7) 2(1.65,7) 3(-1.65,6) 4(1.65,6) 5(-1.65,5) 6(1.65,5) 7(-1.65,4) 8(1.65,4) 9(-1.65,3) 10(1.65,3) 11(-1.65,2) 12(1.65,2) 13(-1.65,1) 14(1.65,1) 15(-1.65,0) 16(1.65,0) 17(-1.65,-1) 18(1.65,-1) 19(-1.65,-2) 20(1.65,-2) 21(-1.65,-3) 22(1.65,-3) 23(-1.65,-4) 24(1.65,-4) 25(-1.65,-5) 26(1.65,-5) 27(-1.65,-6) 28(1.65,-6) 29(-1.65,-7) 30(1.65,-7)
F.SilkS:
  lines w0.12: -2.59,7.51 -1.21,7.51 -1.21,7.56 1.21,7.56 1.21,7.51 ; -1.21,-7.51 -1.21,-7.56 1.21,-7.56 1.21,-7.51
F.CrtYd:
  lines w0.05: -3.65,-8 3.65,-8 3.65,8 -3.65,8 -3.65,-8
F.Fab:
  lines w0.1: -1.15,-7.15 -2.4,-7.15 -2.4,-6.85 -1.15,-6.85 ; -1.15,-6.15 -2.4,-6.15 -2.4,-5.85 -1.15,-5.85 ; -1.15,-5.15 -2.4,-5.15 -2.4,-4.85 -1.15,-4.85 ; -1.15,-4.15 -2.4,-4.15 -2.4,-3.85 -1.15,-3.85 ; -1.15,-3.15 -2.4,-3.15 -2.4,-2.85 -1.15,-2.85 ; -1.15,-2.15 -2.4,-2.15 -2.4,-1.85 -1.15,-1.85 ; -1.15,-1.15 -2.4,-1.15 -2.4,-0.85 -1.15,-0.85 ; -1.15,-0.15 -2.4,-0.15 -2.4,0.15 -1.15,0.15 ; -1.15,0.85 -2.4,0.85 -2.4,1.15 -1.15,1.15 ; -1.15,1.85 -2.4,1.85 -2.4,2.15 -1.15,2.15 ; -1.15,2.85 -2.4,2.85 -2.4,3.15 -1.15,3.15 ; -1.15,3.85 -2.4,3.85 -2.4,4.15 -1.15,4.15 ; -1.15,4.85 -2.4,4.85 -2.4,5.15 -1.15,5.15 ; -1.15,5.85 -2.4,5.85 -2.4,6.15 -1.15,6.15 ; -1.15,6.85 -2.4,6.85 -2.4,7.15 -1.15,7.15 ; 1.15,-7.15 2.4,-7.15 2.4,-6.85 1.15,-6.85 ; 1.15,-6.15 2.4,-6.15 2.4,-5.85 1.15,-5.85 ; 1.15,-5.15 2.4,-5.15 2.4,-4.85 1.15,-4.85 ; 1.15,-4.15 2.4,-4.15 2.4,-3.85 1.15,-3.85 ; 1.15,-3.15 2.4,-3.15 2.4,-2.85 1.15,-2.85 ; 1.15,-2.15 2.4,-2.15 2.4,-1.85 1.15,-1.85 ; 1.15,-1.15 2.4,-1.15 2.4,-0.85 1.15,-0.85 ; 1.15,-0.15 2.4,-0.15 2.4,0.15 1.15,0.15 ; 1.15,0.85 2.4,0.85 2.4,1.15 1.15,1.15 ; 1.15,1.85 2.4,1.85 2.4,2.15 1.15,2.15 ; 1.15,2.85 2.4,2.85 2.4,3.15 1.15,3.15 ; 1.15,3.85 2.4,3.85 2.4,4.15 1.15,4.15 ; 1.15,4.85 2.4,4.85 2.4,5.15 1.15,5.15 ; 1.15,5.85 2.4,5.85 2.4,6.15 1.15,6.15 ; 1.15,6.85 2.4,6.85 2.4,7.15 1.15,7.15 ; -1.15,7.15 -1.15,-7.5 1.15,-7.5 1.15,7.5 -0.8,7.5 -1.15,7.15
  text "'.Designator'" at 0.84,-4.047 h1

## PinHeader_2x16_P1.00mm_Horizontal [mm]
pads (32):
  rect 0.85x0.85 hole 0.5: 1(0,0)
  rrect100% 0.85x0.85 hole 0.5: 2(1,0) 3(0,-1) 4(1,-1) 5(0,-2) 6(1,-2) 7(0,-3) 8(1,-3) 9(0,-4) 10(1,-4) 11(0,-5) 12(1,-5) 13(0,-6) 14(1,-6) 15(0,-7) 16(1,-7) 17(0,-8) 18(1,-8) 19(0,-9) 20(1,-9) 21(0,-10) 22(1,-10) 23(0,-11) 24(1,-11) 25(0,-12) 26(1,-12) 27(0,-13) 28(1,-13) 29(0,-14) 30(1,-14) 31(0,-15) 32(1,-15)
F.SilkS:
  lines w0.12: -0.685,0 -0.685,0.685 0,0.685 ; 1.652,-15.21 1.84,-15.21 ; 1.652,-14.79 1.84,-14.79 ; 1.652,-14.21 1.84,-14.21 ; 1.652,-13.79 1.84,-13.79 ; 1.652,-13.21 1.84,-13.21 ; 1.652,-12.79 1.84,-12.79 ; 1.652,-12.21 1.84,-12.21 ; 1.652,-11.79 1.84,-11.79 ; 1.652,-11.21 1.84,-11.21 ; 1.652,-10.79 1.84,-10.79 ; 1.652,-10.21 1.84,-10.21 ; 1.652,-9.79 1.84,-9.79 ; 1.652,-9.21 1.84,-9.21 ; 1.652,-8.79 1.84,-8.79 ; 1.652,-8.21 1.84,-8.21 ; 1.652,-7.79 1.84,-7.79 ; 1.652,-7.21 1.84,-7.21 ; 1.652,-6.79 1.84,-6.79 ; 1.652,-6.21 1.84,-6.21 ; 1.652,-5.79 1.84,-5.79 ; 1.652,-5.21 1.84,-5.21 ; 1.652,-4.79 1.84,-4.79 ; 1.652,-4.21 1.84,-4.21 ; 1.652,-3.79 1.84,-3.79 ; 1.652,-3.21 1.84,-3.21 ; 1.652,-2.79 1.84,-2.79 ; 1.652,-2.21 1.84,-2.21 ; 1.652,-1.79 1.84,-1.79 ; 1.652,-1.21 1.84,-1.21 ; 1.652,-0.79 1.84,-0.79 ; 1.652,-0.21 1.84,-0.21 ; 1.652,0.21 1.84,0.21 ; 1.84,-14.5 3.16,-14.5 ; 1.84,-13.5 3.16,-13.5 ; 1.84,-12.5 3.16,-12.5 ; 1.84,-11.5 3.16,-11.5 ; 1.84,-10.5 3.16,-10.5 ; 1.84,-9.5 3.16,-9.5 ; 1.84,-8.5 3.16,-8.5 ; 1.84,-7.5 3.16,-7.5 ; 1.84,-6.5 3.16,-6.5 ; 1.84,-5.5 3.16,-5.5 ; 1.84,-4.5 3.16,-4.5 ; 1.84,-3.5 3.16,-3.5 ; 1.84,-2.5 3.16,-2.5 ; 1.84,-1.5 3.16,-1.5 ; 1.84,-0.5 3.16,-0.5 ; 3.16,-15.21 5.16,-15.21 5.16,-14.79 3.16,-14.79 ; 3.16,-14.21 5.16,-14.21 5.16,-13.79 3.16,-13.79 ; 3.16,-13.21 5.16,-13.21 5.16,-12.79 3.16,-12.79 ; 3.16,-12.21 5.16,-12.21 5.16,-11.79 3.16,-11.79 ; 3.16,-11.21 5.16,-11.21 5.16,-10.79 3.16,-10.79 ; 3.16,-10.21 5.16,-10.21 5.16,-9.79 3.16,-9.79 ; 3.16,-9.21 5.16,-9.21 5.16,-8.79 3.16,-8.79 ; 3.16,-8.21 5.16,-8.21 5.16,-7.79 3.16,-7.79 ; 3.16,-7.21 5.16,-7.21 5.16,-6.79 3.16,-6.79 ; 3.16,-6.21 5.16,-6.21 5.16,-5.79 3.16,-5.79 ; 3.16,-5.21 5.16,-5.21 5.16,-4.79 3.16,-4.79 ; 3.16,-4.21 5.16,-4.21 5.16,-3.79 3.16,-3.79 ; 3.16,-3.21 5.16,-3.21 5.16,-2.79 3.16,-2.79 ; 3.16,-2.21 5.16,-2.21 5.16,-1.79 3.16,-1.79 ; 3.16,-1.21 5.16,-1.21 5.16,-0.79 3.16,-0.79 ; 3.16,-0.21 5.16,-0.21 5.16,0.21 3.16,0.21 ; 3.16,-0.09 5.16,-0.09 ; 3.16,0.03 5.16,0.03 ; 3.16,0.15 5.16,0.15 ; 1.84,-15.56 3.16,-15.56 3.16,0.56 1.84,0.56 1.84,-15.56
F.CrtYd:
  lines w0.05: -1,-16 5.6,-16 5.6,1 -1,1 -1,-16
F.Fab:
  lines w0.1: 1.9,-15.15 -0.15,-15.15 -0.15,-14.85 1.9,-14.85 ; 1.9,-14.15 -0.15,-14.15 -0.15,-13.85 1.9,-13.85 ; 1.9,-13.15 -0.15,-13.15 -0.15,-12.85 1.9,-12.85 ; 1.9,-12.15 -0.15,-12.15 -0.15,-11.85 1.9,-11.85 ; 1.9,-11.15 -0.15,-11.15 -0.15,-10.85 1.9,-10.85 ; 1.9,-10.15 -0.15,-10.15 -0.15,-9.85 1.9,-9.85 ; 1.9,-9.15 -0.15,-9.15 -0.15,-8.85 1.9,-8.85 ; 1.9,-8.15 -0.15,-8.15 -0.15,-7.85 1.9,-7.85 ; 1.9,-7.15 -0.15,-7.15 -0.15,-6.85 1.9,-6.85 ; 1.9,-6.15 -0.15,-6.15 -0.15,-5.85 1.9,-5.85 ; 1.9,-5.15 -0.15,-5.15 -0.15,-4.85 1.9,-4.85 ; 1.9,-4.15 -0.15,-4.15 -0.15,-3.85 1.9,-3.85 ; 1.9,-3.15 -0.15,-3.15 -0.15,-2.85 1.9,-2.85 ; 1.9,-2.15 -0.15,-2.15 -0.15,-1.85 1.9,-1.85 ; 1.9,-1.15 -0.15,-1.15 -0.15,-0.85 1.9,-0.85 ; 1.9,-0.15 -0.15,-0.15 -0.15,0.15 1.9,0.15 ; 3.1,-15.15 5.1,-15.15 5.1,-14.85 3.1,-14.85 ; 3.1,-14.15 5.1,-14.15 5.1,-13.85 3.1,-13.85 ; 3.1,-13.15 5.1,-13.15 5.1,-12.85 3.1,-12.85 ; 3.1,-12.15 5.1,-12.15 5.1,-11.85 3.1,-11.85 ; 3.1,-11.15 5.1,-11.15 5.1,-10.85 3.1,-10.85 ; 3.1,-10.15 5.1,-10.15 5.1,-9.85 3.1,-9.85 ; 3.1,-9.15 5.1,-9.15 5.1,-8.85 3.1,-8.85 ; 3.1,-8.15 5.1,-8.15 5.1,-7.85 3.1,-7.85 ; 3.1,-7.15 5.1,-7.15 5.1,-6.85 3.1,-6.85 ; 3.1,-6.15 5.1,-6.15 5.1,-5.85 3.1,-5.85 ; 3.1,-5.15 5.1,-5.15 5.1,-4.85 3.1,-4.85 ; 3.1,-4.15 5.1,-4.15 5.1,-3.85 3.1,-3.85 ; 3.1,-3.15 5.1,-3.15 5.1,-2.85 3.1,-2.85 ; 3.1,-2.15 5.1,-2.15 5.1,-1.85 3.1,-1.85 ; 3.1,-1.15 5.1,-1.15 5.1,-0.85 3.1,-0.85 ; 3.1,-0.15 5.1,-0.15 5.1,0.15 3.1,0.15 ; 1.9,-15.5 1.9,0.2 2.2,0.5 3.1,0.5 3.1,-15.5 1.9,-15.5
  text "'.Designator'" at 3.105,-10.414 h0.72

## PinHeader_2x16_P1.00mm_Vertical [mm]
pads (32):
  rect 0.85x0.85 hole 0.5: 1(0,0)
  rrect100% 0.85x0.85 hole 0.5: 2(1,0) 3(0,-1) 4(1,-1) 5(0,-2) 6(1,-2) 7(0,-3) 8(1,-3) 9(0,-4) 10(1,-4) 11(0,-5) 12(1,-5) 13(0,-6) 14(1,-6) 15(0,-7) 16(1,-7) 17(0,-8) 18(1,-8) 19(0,-9) 20(1,-9) 21(0,-10) 22(1,-10) 23(0,-11) 24(1,-11) 25(0,-12) 26(1,-12) 27(0,-13) 28(1,-13) 29(0,-14) 30(1,-14) 31(0,-15) 32(1,-15)
F.SilkS:
  lines w0.12: -0.71,0 -0.71,0.685 0,0.685 ; -0.608,-0.685 -0.71,-0.685 -0.71,-15.56 -0.394,-15.56 ; 0.394,-15.56 0.606,-15.56 ; 1.394,-15.56 1.71,-15.56 1.71,0.56 1.394,0.56
F.CrtYd:
  lines w0.05: -1.15,-16 2.15,-16 2.15,1 -1.15,1 -1.15,-16
F.Fab:
  lines w0.1: -0.65,-15.5 1.65,-15.5 1.65,0.5 -0.075,0.5 -0.65,-0.075 -0.65,-15.5
  text "'.Designator'" at 1.34,-11.547 h1

## PinHeader_2x16_P1.00mm_Vertical_SMD [mm]
pads (32):
  rect 2x0.5 smd: 1(-1.65,7.5) 2(1.65,7.5) 3(-1.65,6.5) 4(1.65,6.5) 5(-1.65,5.5) 6(1.65,5.5) 7(-1.65,4.5) 8(1.65,4.5) 9(-1.65,3.5) 10(1.65,3.5) 11(-1.65,2.5) 12(1.65,2.5) 13(-1.65,1.5) 14(1.65,1.5) 15(-1.65,0.5) 16(1.65,0.5) 17(-1.65,-0.5) 18(1.65,-0.5) 19(-1.65,-1.5) 20(1.65,-1.5) 21(-1.65,-2.5) 22(1.65,-2.5) 23(-1.65,-3.5) 24(1.65,-3.5) 25(-1.65,-4.5) 26(1.65,-4.5) 27(-1.65,-5.5) 28(1.65,-5.5) 29(-1.65,-6.5) 30(1.65,-6.5) 31(-1.65,-7.5) 32(1.65,-7.5)
F.SilkS:
  lines w0.12: -2.59,8.01 -1.21,8.01 -1.21,8.06 1.21,8.06 1.21,8.01 ; -1.21,-8.01 -1.21,-8.06 1.21,-8.06 1.21,-8.01
F.CrtYd:
  lines w0.05: -3.65,-8.5 -3.65,8.5 3.65,8.5 3.65,-8.5 -3.65,-8.5
F.Fab:
  lines w0.1: -1.15,-7.65 -2.4,-7.65 -2.4,-7.35 -1.15,-7.35 ; -1.15,-6.65 -2.4,-6.65 -2.4,-6.35 -1.15,-6.35 ; -1.15,-5.65 -2.4,-5.65 -2.4,-5.35 -1.15,-5.35 ; -1.15,-4.65 -2.4,-4.65 -2.4,-4.35 -1.15,-4.35 ; -1.15,-3.65 -2.4,-3.65 -2.4,-3.35 -1.15,-3.35 ; -1.15,-2.65 -2.4,-2.65 -2.4,-2.35 -1.15,-2.35 ; -1.15,-1.65 -2.4,-1.65 -2.4,-1.35 -1.15,-1.35 ; -1.15,-0.65 -2.4,-0.65 -2.4,-0.35 -1.15,-0.35 ; -1.15,0.35 -2.4,0.35 -2.4,0.65 -1.15,0.65 ; -1.15,1.35 -2.4,1.35 -2.4,1.65 -1.15,1.65 ; -1.15,2.35 -2.4,2.35 -2.4,2.65 -1.15,2.65 ; -1.15,3.35 -2.4,3.35 -2.4,3.65 -1.15,3.65 ; -1.15,4.35 -2.4,4.35 -2.4,4.65 -1.15,4.65 ; -1.15,5.35 -2.4,5.35 -2.4,5.65 -1.15,5.65 ; -1.15,6.35 -2.4,6.35 -2.4,6.65 -1.15,6.65 ; -1.15,7.35 -2.4,7.35 -2.4,7.65 -1.15,7.65 ; 1.15,-7.65 2.4,-7.65 2.4,-7.35 1.15,-7.35 ; 1.15,-6.65 2.4,-6.65 2.4,-6.35 1.15,-6.35 ; 1.15,-5.65 2.4,-5.65 2.4,-5.35 1.15,-5.35 ; 1.15,-4.65 2.4,-4.65 2.4,-4.35 1.15,-4.35 ; 1.15,-3.65 2.4,-3.65 2.4,-3.35 1.15,-3.35 ; 1.15,-2.65 2.4,-2.65 2.4,-2.35 1.15,-2.35 ; 1.15,-1.65 2.4,-1.65 2.4,-1.35 1.15,-1.35 ; 1.15,-0.65 2.4,-0.65 2.4,-0.35 1.15,-0.35 ; 1.15,0.35 2.4,0.35 2.4,0.65 1.15,0.65 ; 1.15,1.35 2.4,1.35 2.4,1.65 1.15,1.65 ; 1.15,2.35 2.4,2.35 2.4,2.65 1.15,2.65 ; 1.15,3.35 2.4,3.35 2.4,3.65 1.15,3.65 ; 1.15,4.35 2.4,4.35 2.4,4.65 1.15,4.65 ; 1.15,5.35 2.4,5.35 2.4,5.65 1.15,5.65 ; 1.15,6.35 2.4,6.35 2.4,6.65 1.15,6.65 ; 1.15,7.35 2.4,7.35 2.4,7.65 1.15,7.65 ; -1.15,7.65 -1.15,-8 1.15,-8 1.15,8 -0.8,8 -1.15,7.65
  text "'.Designator'" at 0.84,-4.047 h1

## PinHeader_2x17_P1.00mm_Horizontal [mm]
pads (34):
  rect 0.85x0.85 hole 0.5: 1(0,0)
  rrect100% 0.85x0.85 hole 0.5: 2(1,0) 3(0,-1) 4(1,-1) 5(0,-2) 6(1,-2) 7(0,-3) 8(1,-3) 9(0,-4) 10(1,-4) 11(0,-5) 12(1,-5) 13(0,-6) 14(1,-6) 15(0,-7) 16(1,-7) 17(0,-8) 18(1,-8) 19(0,-9) 20(1,-9) 21(0,-10) 22(1,-10) 23(0,-11) 24(1,-11) 25(0,-12) 26(1,-12) 27(0,-13) 28(1,-13) 29(0,-14) 30(1,-14) 31(0,-15) 32(1,-15) 33(0,-16) 34(1,-16)
F.SilkS:
  lines w0.12: -0.685,0 -0.685,0.685 0,0.685 ; 1.652,-16.21 1.84,-16.21 ; 1.652,-15.79 1.84,-15.79 ; 1.652,-15.21 1.84,-15.21 ; 1.652,-14.79 1.84,-14.79 ; 1.652,-14.21 1.84,-14.21 ; 1.652,-13.79 1.84,-13.79 ; 1.652,-13.21 1.84,-13.21 ; 1.652,-12.79 1.84,-12.79 ; 1.652,-12.21 1.84,-12.21 ; 1.652,-11.79 1.84,-11.79 ; 1.652,-11.21 1.84,-11.21 ; 1.652,-10.79 1.84,-10.79 ; 1.652,-10.21 1.84,-10.21 ; 1.652,-9.79 1.84,-9.79 ; 1.652,-9.21 1.84,-9.21 ; 1.652,-8.79 1.84,-8.79 ; 1.652,-8.21 1.84,-8.21 ; 1.652,-7.79 1.84,-7.79 ; 1.652,-7.21 1.84,-7.21 ; 1.652,-6.79 1.84,-6.79 ; 1.652,-6.21 1.84,-6.21 ; 1.652,-5.79 1.84,-5.79 ; 1.652,-5.21 1.84,-5.21 ; 1.652,-4.79 1.84,-4.79 ; 1.652,-4.21 1.84,-4.21 ; 1.652,-3.79 1.84,-3.79 ; 1.652,-3.21 1.84,-3.21 ; 1.652,-2.79 1.84,-2.79 ; 1.652,-2.21 1.84,-2.21 ; 1.652,-1.79 1.84,-1.79 ; 1.652,-1.21 1.84,-1.21 ; 1.652,-0.79 1.84,-0.79 ; 1.652,-0.21 1.84,-0.21 ; 1.652,0.21 1.84,0.21 ; 1.84,-15.5 3.16,-15.5 ; 1.84,-14.5 3.16,-14.5 ; 1.84,-13.5 3.16,-13.5 ; 1.84,-12.5 3.16,-12.5 ; 1.84,-11.5 3.16,-11.5 ; 1.84,-10.5 3.16,-10.5 ; 1.84,-9.5 3.16,-9.5 ; 1.84,-8.5 3.16,-8.5 ; 1.84,-7.5 3.16,-7.5 ; 1.84,-6.5 3.16,-6.5 ; 1.84,-5.5 3.16,-5.5 ; 1.84,-4.5 3.16,-4.5 ; 1.84,-3.5 3.16,-3.5 ; 1.84,-2.5 3.16,-2.5 ; 1.84,-1.5 3.16,-1.5 ; 1.84,-0.5 3.16,-0.5 ; 3.16,-16.21 5.16,-16.21 5.16,-15.79 3.16,-15.79 ; 3.16,-15.21 5.16,-15.21 5.16,-14.79 3.16,-14.79 ; 3.16,-14.21 5.16,-14.21 5.16,-13.79 3.16,-13.79 ; 3.16,-13.21 5.16,-13.21 5.16,-12.79 3.16,-12.79 ; 3.16,-12.21 5.16,-12.21 5.16,-11.79 3.16,-11.79 ; 3.16,-11.21 5.16,-11.21 5.16,-10.79 3.16,-10.79 ; 3.16,-10.21 5.16,-10.21 5.16,-9.79 3.16,-9.79 ; 3.16,-9.21 5.16,-9.21 5.16,-8.79 3.16,-8.79 ; 3.16,-8.21 5.16,-8.21 5.16,-7.79 3.16,-7.79 ; 3.16,-7.21 5.16,-7.21 5.16,-6.79 3.16,-6.79 ; 3.16,-6.21 5.16,-6.21 5.16,-5.79 3.16,-5.79 ; 3.16,-5.21 5.16,-5.21 5.16,-4.79 3.16,-4.79 ; 3.16,-4.21 5.16,-4.21 5.16,-3.79 3.16,-3.79 ; 3.16,-3.21 5.16,-3.21 5.16,-2.79 3.16,-2.79 ; 3.16,-2.21 5.16,-2.21 5.16,-1.79 3.16,-1.79 ; 3.16,-1.21 5.16,-1.21 5.16,-0.79 3.16,-0.79 ; 3.16,-0.21 5.16,-0.21 5.16,0.21 3.16,0.21 ; 3.16,-0.09 5.16,-0.09 ; 3.16,0.03 5.16,0.03 ; 3.16,0.15 5.16,0.15 ; 1.84,-16.56 1.84,0.56 3.16,0.56 3.16,-16.56 1.84,-16.56
F.CrtYd:
  lines w0.05: -1,-17 -1,1 5.6,1 5.6,-17 -1,-17
F.Fab:
  lines w0.1: 1.9,-16.15 -0.15,-16.15 -0.15,-15.85 1.9,-15.85 ; 1.9,-15.15 -0.15,-15.15 -0.15,-14.85 1.9,-14.85 ; 1.9,-14.15 -0.15,-14.15 -0.15,-13.85 1.9,-13.85 ; 1.9,-13.15 -0.15,-13.15 -0.15,-12.85 1.9,-12.85 ; 1.9,-12.15 -0.15,-12.15 -0.15,-11.85 1.9,-11.85 ; 1.9,-11.15 -0.15,-11.15 -0.15,-10.85 1.9,-10.85 ; 1.9,-10.15 -0.15,-10.15 -0.15,-9.85 1.9,-9.85 ; 1.9,-9.15 -0.15,-9.15 -0.15,-8.85 1.9,-8.85 ; 1.9,-8.15 -0.15,-8.15 -0.15,-7.85 1.9,-7.85 ; 1.9,-7.15 -0.15,-7.15 -0.15,-6.85 1.9,-6.85 ; 1.9,-6.15 -0.15,-6.15 -0.15,-5.85 1.9,-5.85 ; 1.9,-5.15 -0.15,-5.15 -0.15,-4.85 1.9,-4.85 ; 1.9,-4.15 -0.15,-4.15 -0.15,-3.85 1.9,-3.85 ; 1.9,-3.15 -0.15,-3.15 -0.15,-2.85 1.9,-2.85 ; 1.9,-2.15 -0.15,-2.15 -0.15,-1.85 1.9,-1.85 ; 1.9,-1.15 -0.15,-1.15 -0.15,-0.85 1.9,-0.85 ; 1.9,-0.15 -0.15,-0.15 -0.15,0.15 1.9,0.15 ; 3.1,-16.15 5.1,-16.15 5.1,-15.85 3.1,-15.85 ; 3.1,-15.15 5.1,-15.15 5.1,-14.85 3.1,-14.85 ; 3.1,-14.15 5.1,-14.15 5.1,-13.85 3.1,-13.85 ; 3.1,-13.15 5.1,-13.15 5.1,-12.85 3.1,-12.85 ; 3.1,-12.15 5.1,-12.15 5.1,-11.85 3.1,-11.85 ; 3.1,-11.15 5.1,-11.15 5.1,-10.85 3.1,-10.85 ; 3.1,-10.15 5.1,-10.15 5.1,-9.85 3.1,-9.85 ; 3.1,-9.15 5.1,-9.15 5.1,-8.85 3.1,-8.85 ; 3.1,-8.15 5.1,-8.15 5.1,-7.85 3.1,-7.85 ; 3.1,-7.15 5.1,-7.15 5.1,-6.85 3.1,-6.85 ; 3.1,-6.15 5.1,-6.15 5.1,-5.85 3.1,-5.85 ; 3.1,-5.15 5.1,-5.15 5.1,-4.85 3.1,-4.85 ; 3.1,-4.15 5.1,-4.15 5.1,-3.85 3.1,-3.85 ; 3.1,-3.15 5.1,-3.15 5.1,-2.85 3.1,-2.85 ; 3.1,-2.15 5.1,-2.15 5.1,-1.85 3.1,-1.85 ; 3.1,-1.15 5.1,-1.15 5.1,-0.85 3.1,-0.85 ; 3.1,-0.15 5.1,-0.15 5.1,0.15 3.1,0.15 ; 1.9,-16.5 3.1,-16.5 3.1,0.5 2.2,0.5 1.9,0.2 1.9,-16.5
  text "'.Designator'" at 3.105,-10.914 h0.72

## PinHeader_2x17_P1.00mm_Vertical [mm]
pads (34):
  rect 0.85x0.85 hole 0.5: 1(0,0)
  rrect100% 0.85x0.85 hole 0.5: 2(1,0) 3(0,-1) 4(1,-1) 5(0,-2) 6(1,-2) 7(0,-3) 8(1,-3) 9(0,-4) 10(1,-4) 11(0,-5) 12(1,-5) 13(0,-6) 14(1,-6) 15(0,-7) 16(1,-7) 17(0,-8) 18(1,-8) 19(0,-9) 20(1,-9) 21(0,-10) 22(1,-10) 23(0,-11) 24(1,-11) 25(0,-12) 26(1,-12) 27(0,-13) 28(1,-13) 29(0,-14) 30(1,-14) 31(0,-15) 32(1,-15) 33(0,-16) 34(1,-16)
F.SilkS:
  lines w0.12: -0.71,0 -0.71,0.685 0,0.685 ; -0.608,-0.685 -0.71,-0.685 -0.71,-16.56 -0.394,-16.56 ; 0.394,-16.56 0.606,-16.56 ; 1.394,-16.56 1.71,-16.56 1.71,0.56 1.394,0.56
F.CrtYd:
  lines w0.05: -1.15,-17 2.15,-17 2.15,1 -1.15,1 -1.15,-17
F.Fab:
  lines w0.1: -0.65,-16.5 -0.65,-0.075 -0.075,0.5 1.65,0.5 1.65,-16.5 -0.65,-16.5
  text "'.Designator'" at 1.34,-12.047 h1